# Altium footprint library lib_eps.PcbLib: 113 footprints (part 3 of 8)
Each footprint in its own frame and in the unit in brackets; x right, y up, seen from the top. Pads: shape width x height; smd on the part's side, far side on the other; paste and mask are expansions set on the pad; w line width, h text height; cw(c..) or ccw(c..) is an arc to the next point about the centre after c.
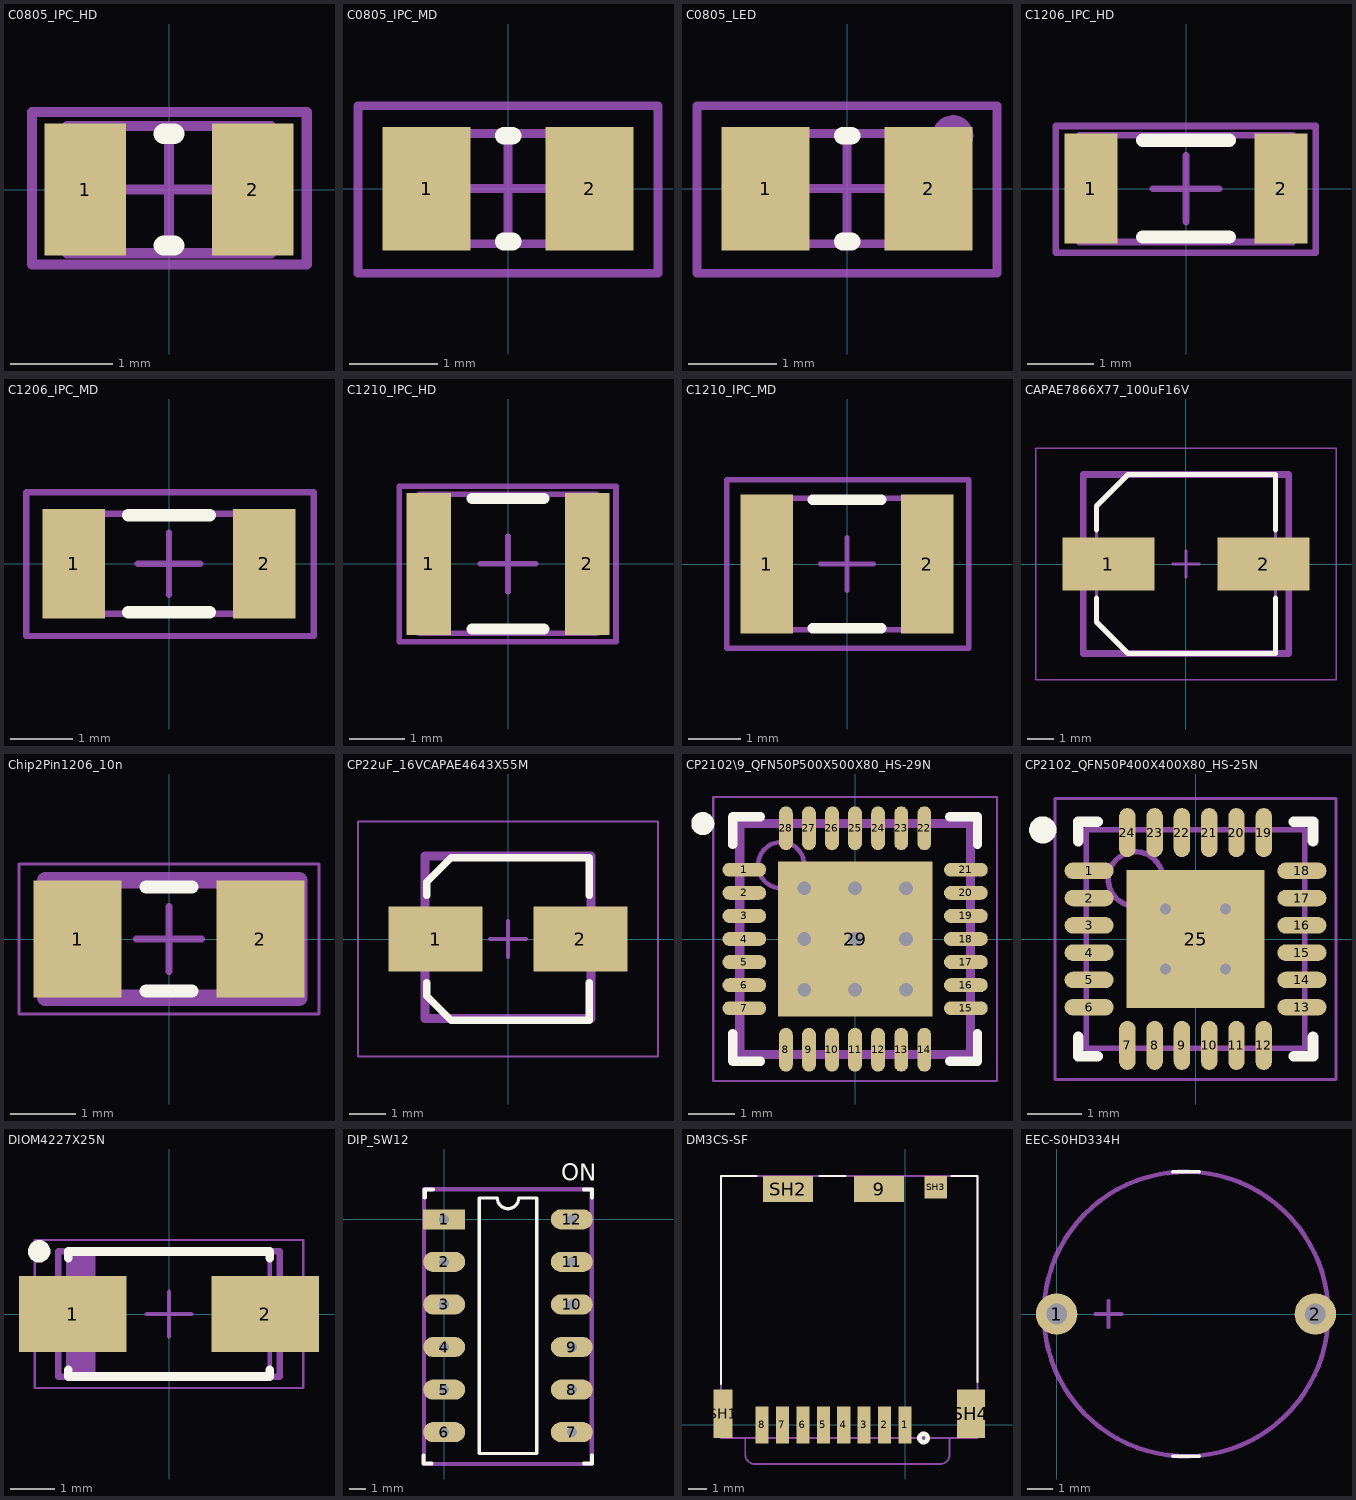
[diagram p2: the footprints below, top view; thin cyan lines are the x and y axes]

## C0805_IPC_HD [mm] "Chip Capacitor, 2-Leads, Body 2,00x1,25mm, IPC High Density"
height 1.25
pads (2):
  rect 0.8x1.3 smd: 1(-0.825,0) 2(0.825,0)
Top Overlay:
  lines w0.2: -0.05,-0.55 0.05,-0.55 ; -0.05,0.55 0.05,0.55
Mechanical 13:
  lines w0.1: -1,-0.625 -1,0.625 1,0.625 1,-0.625 -1,-0.625
Mechanical 15:
  lines w0.05: -1.35,-0.75 -1.35,0.75 1.35,0.75 1.35,-0.75 -1.35,-0.75
  lines w0.1: -0.5,0 0.5,0 ; 0,-0.5 0,0.5
Mechanical 29:
  lines w0.1: -1.346,-0.738 1.354,-0.738 1.354,0.762 -1.346,0.762 -1.346,-0.738
  text ".Designator" at -1.143,-0.356 h0.7
3D body "C0805_IPC_HD.step": height 1.25, standoff 0, extent -1,-0.625 1,0.625

## C0805_IPC_MD [mm] "Chip Capacitor, 2-Leads, Body 2,00x1,25mm, IPC Medium Density"
height 1.25
pads (2):
  rect 1x1.4 smd: 1(-0.925,0) 2(0.925,0)
Top Overlay:
  lines w0.2: -0.05,-0.6 0.05,-0.6 ; -0.05,0.6 0.05,0.6
Mechanical 13:
  lines w0.1: -1,-0.625 -1,0.625 1,0.625 1,-0.625 -1,-0.625
Mechanical 15:
  lines w0.05: -1.7,-0.95 -1.7,0.95 1.7,0.95 1.7,-0.95 -1.7,-0.95
  lines w0.1: -0.5,0 0.5,0 ; 0,-0.5 0,0.5
Mechanical 29:
  lines w0.1: -1.702,-0.96 1.698,-0.96 1.698,0.94 -1.702,0.94 -1.702,-0.96
  text ".Designator" at -1.422,-0.356 h0.7
3D body "C0805_IPC_MD.step": height 1.25, standoff 0, extent -1,-0.625 1,0.625

## C0805_LED [mm] "Chip Capacitor, 2-Leads, Body 2,00x1,25mm, IPC Medium Density"
height 1.25
pads (2):
  rect 1x1.4 smd: 1(-0.925,0) 2(0.925,0)
Top Overlay:
  lines w0.2: -0.05,-0.6 0.05,-0.6 ; -0.05,0.6 0.05,0.6
Mechanical 13:
  lines w0.1: -1,-0.625 -1,0.625 1,0.625 1,-0.625 -1,-0.625
Mechanical 15:
  lines w0.05: -1.7,-0.95 -1.7,0.95 1.7,0.95 1.7,-0.95 -1.7,-0.95
  lines w0.1: -0.5,0 0.5,0 ; 0,-0.5 0,0.5
Mechanical 29:
  circle w0.18: c1.2,0.6 r0.141
  lines w0.1: -1.702,-0.96 1.698,-0.96 1.698,0.94 -1.702,0.94 -1.702,-0.96
  text ".Designator" at -1.422,-0.356 h0.7
3D body "BL-LS0805UWC.STEP": height 0.8, standoff 0, extent -0.925,-0.625 0.875,0.625

## C1206_IPC_HD [mm] "Chip Capacitor, 2-Leads, Body 3,20x1,60mm, IPC High Density"
height 1.6
pads (2):
  rect 0.8x1.65 smd: 1(-1.425,0) 2(1.425,0)
Top Overlay:
  lines w0.2: -0.65,-0.725 0.65,-0.725 ; -0.65,0.725 0.65,0.725
Mechanical 13:
  lines w0.1: -1.6,-0.8 1.6,-0.8 1.6,0.8 -1.6,0.8 -1.6,-0.8
Mechanical 15:
  lines w0.05: -1.95,-0.95 1.95,-0.95 1.95,0.95 -1.95,0.95 -1.95,-0.95
  lines w0.1: -0.5,0 0.5,0 ; 0,-0.5 0,0.5
Mechanical 29:
  lines w0.1: -1.956,-0.96 -1.956,0.94 1.944,0.94 1.944,-0.96 -1.956,-0.96
  text ".Designator" at -1.676,-0.457 h0.8
3D body "C1206_IPC_HD.step": height 1.6, standoff 0, extent -1.6,-0.8 1.6,0.8

## C1206_IPC_MD [mm] "Chip Capacitor, 2-Leads, Body 3,20x1,60mm, IPC Medium Density"
height 1.6
pads (2):
  rect 1x1.75 smd: 1(-1.525,0) 2(1.525,0)
Top Overlay:
  lines w0.2: -0.65,-0.775 0.65,-0.775 ; -0.65,0.775 0.65,0.775
Mechanical 13:
  lines w0.1: -1.6,-0.8 1.6,-0.8 1.6,0.8 -1.6,0.8 -1.6,-0.8
Mechanical 15:
  lines w0.05: -2.3,-1.15 2.3,-1.15 2.3,1.15 -2.3,1.15 -2.3,-1.15
  lines w0.1: -0.5,0 0.5,0 ; 0,-0.5 0,0.5
Mechanical 29:
  lines w0.1: -2.286,-1.157 -2.286,1.143 2.314,1.143 2.314,-1.157 -2.286,-1.157
  text ".Designator" at -1.93,-0.432 h0.8
3D body "C1206_IPC_MD.step": height 1.6, standoff 0, extent -1.6,-0.8 1.6,0.8

## C1210_IPC_HD [mm] "Chip Capacitor, 2-Leads, Body 3,20x2,50mm, IPC High Density"
height 2.5
pads (2):
  rect 0.8x2.55 smd: 1(-1.425,0) 2(1.425,0)
Top Overlay:
  lines w0.2: -0.65,-1.175 0.65,-1.175 ; -0.65,1.175 0.65,1.175
Mechanical 13:
  lines w0.1: -1.6,-1.25 1.6,-1.25 1.6,1.25 -1.6,1.25 -1.6,-1.25
Mechanical 15:
  lines w0.05: -1.95,-1.4 1.95,-1.4 1.95,1.4 -1.95,1.4 -1.95,-1.4
  lines w0.1: -0.5,0 0.5,0 ; 0,-0.5 0,0.5
Mechanical 29:
  lines w0.1: -1.956,-1.403 -1.956,1.397 1.944,1.397 1.944,-1.403 -1.956,-1.403
  text ".Designator" at -1.626,-0.432 h0.8
3D body "C1210_IPC_HD.step": height 2.5, standoff 0, extent -1.6,-1.25 1.6,1.25

## C1210_IPC_MD [mm] "Chip Capacitor, 2-Leads, Body 3,20x2,50mm, IPC Medium Density"
height 2.5
pads (2):
  rect 1x2.65 smd: 1(-1.525,0) 2(1.525,0)
Top Overlay:
  lines w0.2: -0.65,-1.225 0.65,-1.225 ; -0.65,1.225 0.65,1.225
Mechanical 13:
  lines w0.1: -1.6,-1.25 1.6,-1.25 1.6,1.25 -1.6,1.25 -1.6,-1.25
Mechanical 15:
  lines w0.05: -2.3,-1.6 2.3,-1.6 2.3,1.6 -2.3,1.6 -2.3,-1.6
  lines w0.1: -0.5,0 0.5,0 ; 0,-0.5 0,0.5
Mechanical 29:
  lines w0.1: -2.286,-1.6 -2.286,1.6 2.314,1.6 2.314,-1.6 -2.286,-1.6
  text ".Designator" at -1.727,-0.432 h0.8
3D body "C1210_IPC_MD.step": height 2.5, standoff 0, extent -1.6,-1.25 1.6,1.25

## CAPAE7866X77_100uF16V [mm] "Aluminum Electrolytic Capacitor, Body 6,60x6,60x7,70mm, IPC Low Density"
height 7.7
pads (2):
  rect 3.5x2 smd: 1(-2.95,0) 2(2.95,0)
Top Overlay:
  lines w0.2: -3.4,-1.3 -3.4,-2.2 -2.2,-3.4 3.4,-3.4 3.4,-1.3 ; -3.4,1.3 -3.4,2.2 -2.2,3.4 3.4,3.4 3.4,1.3
Mechanical 13:
  lines w0.1: -3.4,-2.2 -3.4,2.2 -2.2,3.4 3.4,3.4 3.4,-3.4 -2.2,-3.4 -3.4,-2.2
Mechanical 15:
  lines w0.05: -5.7,-4.4 5.7,-4.4 5.7,4.4 -5.7,4.4 -5.7,-4.4
  lines w0.1: -0.5,0 0.5,0 ; 0,-0.5 0,0.5
Mechanical 29:
  lines w0.254: -3.9,-3.4 3.9,-3.4 3.9,3.4 -3.9,3.4 -3.9,-3.4
  text "'.Designator'" at -3.9,-0.6 h1.52
3D body "CAPAE7866X77_100uF16V.step": height 7.7, standoff 0, extent -3.9,-3.4 3.9,3.4

## Chip2Pin1206_10n [mm]
height 1.25
pads (2):
  rect 1.35x1.8 smd: 1(-1.4,0) 2(1.4,0)
Top Overlay:
  lines w0.2: -0.35,-0.8 0.35,-0.8 ; -0.35,0.8 0.35,0.8
Mechanical 13:
  lines w0.1: -1.675,-0.875 -1.675,0.875 1.675,0.875 1.675,-0.875 -1.675,-0.875
Mechanical 15:
  lines w0.05: -2.3,-1.15 -2.3,1.15 2.3,1.15 2.3,-1.15 -2.3,-1.15
  lines w0.1: -0.5,0 0.5,0 ; 0,-0.5 0,0.5
Mechanical 29:
  lines w0.254: -1.9,-0.9 2,-0.9 2,0.9 -1.9,0.9 -1.9,-0.9
  text "'.Designator'" at -1.5,-0.3 h0.6
3D body "Chip2Pin1206_10n.step": height 1.25, standoff 0, extent -1.675,-0.875 1.675,0.875

## CP22uF_16VCAPAE4643X55M [mm] "Aluminum Electrolytic Capacitor, Body 4,30x4,30x5,50mm, IPC Low Density"
height 5.5
pads (2):
  rect 2.6x1.8 smd: 1(-2,0) 2(2,0)
Top Overlay:
  lines w0.2: -2.25,-1.2 -2.25,-1.575 -1.575,-2.25 2.25,-2.25 2.25,-1.2 ; -2.25,1.2 -2.25,1.575 -1.575,2.25 2.25,2.25 2.25,1.2
Mechanical 13:
  lines w0.1: -2.25,-1.575 -1.575,-2.25 2.25,-2.25 2.25,2.25 -1.575,2.25 -2.25,1.575 -2.25,-1.575
Mechanical 15:
  lines w0.05: -4.15,-3.25 -4.15,3.25 4.15,3.25 4.15,-3.25 -4.15,-3.25
  lines w0.1: -0.5,0 0.5,0 ; 0,-0.5 0,0.5
Mechanical 29:
  lines w0.254: -2.3,-1 -2.3,-2.2 ; -2.3,-2.2 -2.3,2.3 2.3,2.3 2.3,-2.2 -2.3,-2.2
  text "'.Designator'" at -1.7,-0.3 h1
3D body "CP22uF_16VCAPAE4643X55M.step": height 5.5, standoff 0, extent -2.325,-2.25 2.325,2.25

## CP2102\9_QFN50P500X500X80_HS-29N [mm] "QFN, 28-Leads, Body 5,00x5,00mm, Pitch 0,50mm, Thermal Pad 3,35x3,35mm, IPC Medium Density"
height 0.8
pads (29):
  oval 0.95x0.3 smd mask+0.051: 1(-2.4,1.5) 2(-2.4,1) 3(-2.4,0.5) 4(-2.4,0) 5(-2.4,-0.5) 6(-2.4,-1) 7(-2.4,-1.5) 15(2.4,-1.5) 16(2.4,-1) 17(2.4,-0.5) 18(2.4,0) 19(2.4,0.5) 20(2.4,1) 21(2.4,1.5)
  oval 0.3x0.95 smd mask+0.051: 8(-1.5,-2.4) 9(-1,-2.4) 10(-0.5,-2.4) 11(0,-2.4) 12(0.5,-2.4) 13(1,-2.4) 14(1.5,-2.4) 22(1.5,2.4) 23(1,2.4) 24(0.5,2.4) 25(0,2.4) 27(-1,2.4) 28(-1.5,2.4)
  oval 0.3x0.95 smd mask+0.05: 26(-0.5,2.4)
  rect 3.35x3.35 smd mask+0.051: 29(0,0)
via 1.1,-1.1 diameter 0.605 hole 0.3
via 0,-1.1 diameter 0.605 hole 0.3
via -1.1,-1.1 diameter 0.605 hole 0.3
via 1.1,0 diameter 0.605 hole 0.3
via 0,0 diameter 0.605 hole 0.3
via -1.1,0 diameter 0.605 hole 0.3
via 1.1,1.1 diameter 0.605 hole 0.3
via 0,1.1 diameter 0.605 hole 0.3
via -1.1,1.1 diameter 0.605 hole 0.3
Top Overlay:
  circle w0.25: c-3.3,2.5 r0.125
  lines w0.2: -2.65,-2.05 -2.65,-2.65 -2.05,-2.65 ; -2.65,2.05 -2.65,2.65 -2.05,2.65 ; 2.05,-2.65 2.65,-2.65 2.65,-2.05 ; 2.05,2.65 2.65,2.65 2.65,2.05
Mechanical 13:
  circle w0.1: c-1.6,1.6 r0.5
  lines w0.1: -2.5,-2.5 2.5,-2.5 2.5,2.5 -2.5,2.5 -2.5,-2.5
Mechanical 15:
  lines w0.05: -3.075,-3.075 3.075,-3.075 3.075,3.075 -3.075,3.075 -3.075,-3.075
  lines w0.1: -0.5,0 0.5,0 ; 0,-0.5 0,0.5
Mechanical 29:
  lines w0.2: -2.5,-2.475 -2.475,-2.5 2.5,-2.5 2.5,2.5 -2.5,2.5 -2.5,-2.475
  text "'.Designator'" at -2,-0.35 h1
3D body "CP2102_QFN50P500X500X80_HS-29N.step": height 0.8, standoff 0, extent -2.525,-2.525 2.525,2.525

## CP2102_QFN50P400X400X80_HS-25N [mm] "QFN, 24-Leads, Body 4,00x4,00mm, Pitch 0,50mm, Thermal Pad 2,55x2,55mm, IPC Medium Density"
height 0.8
pads (25):
  oval 0.9x0.3 smd: 1(-1.95,1.25) 2(-1.95,0.75) 3(-1.95,0.25) 4(-1.95,-0.25) 5(-1.95,-0.75) 6(-1.95,-1.25) 13(1.95,-1.25) 14(1.95,-0.75) 15(1.95,-0.25) 16(1.95,0.25) 17(1.95,0.75) 18(1.95,1.25)
  oval 0.3x0.9 smd: 7(-1.25,-1.95) 8(-0.75,-1.95) 9(-0.25,-1.95) 10(0.25,-1.95) 11(0.75,-1.95) 12(1.25,-1.95) 19(1.25,1.95) 20(0.75,1.95) 21(0.25,1.95) 22(-0.25,1.95) 23(-0.75,1.95) 24(-1.25,1.95)
  rect 2.53x2.53 smd: 25(0,0)
via 0.55,-0.55 diameter 0.5 hole 0.2
via -0.55,-0.55 diameter 0.5 hole 0.2
via 0.55,0.55 diameter 0.5 hole 0.2
via -0.55,0.55 diameter 0.5 hole 0.2
Top Overlay:
  circle w0.25: c-2.8,2 r0.125
  lines w0.2: -2.15,-1.8 -2.15,-2.15 -1.8,-2.15 ; -2.15,1.8 -2.15,2.15 -1.8,2.15 ; 1.8,-2.15 2.15,-2.15 2.15,-1.8 ; 1.8,2.15 2.15,2.15 2.15,1.8
Mechanical 13:
  circle w0.1: c-1.1,1.1 r0.5
  lines w0.1: -2,-2 2,-2 2,2 -2,2 -2,-2
Mechanical 15:
  lines w0.05: -2.575,-2.575 2.575,-2.575 2.575,2.575 -2.575,2.575 -2.575,-2.575
  lines w0.1: -0.5,0 0.5,0 ; 0,-0.5 0,0.5
3D body "CP2102_QFN50P400X400X80_HS-25N.step": height 0.8, standoff 0, extent -2.025,-2.025 2.025,2.025

## DIOM4227X25N [mm] "Molded Diode, 2-Leads, Body 4,24x2,67mm, IPC Medium Density"
height 2.5
pads (2):
  rect 2.4x1.7 smd: 1(-2.15,0) 2(2.15,0)
Top Overlay:
  circle w0.25: c-2.9,1.4 r0.125
  lines w0.2: -2.25,-1.25 -2.25,-1.4 2.25,-1.4 2.25,-1.25 ; -2.25,1.25 -2.25,1.4 2.25,1.4 2.25,1.25
Mechanical 13:
  rectangle: -2.25,-1.4 -1.645,1.4
  lines w0.1: -2.25,-1.4 2.25,-1.4 2.25,1.4 -2.25,1.4 -2.25,-1.4
Mechanical 15:
  lines w0.05: -3,-1.65 3,-1.65 3,1.65 -3,1.65 -3,-1.65
  lines w0.1: -0.5,0 0.5,0 ; 0,-0.5 0,0.5
Mechanical 29:
  lines w0.15: -2.475,-1.4 2.475,-1.4 2.475,1.4 -2.475,1.4 -2.475,-1.4
  text "'.Designator'" at -2.075,-0.5 h1
3D body "DIOM4227X25N.step": height 2.5, standoff 0, extent -2.47,-1.4 2.47,1.4

## DIP_SW12 [mm]
pads (12):
  rect 2.5x1.2 hole 0.6: 1(0,0)
  oval 2.5x1.2 hole 0.6: 2(0,-2.54) 3(0,-5.08) 4(0,-7.62) 5(0,-10.16) 6(0,-12.7) 7(7.62,-12.7) 8(7.62,-10.16) 9(7.62,-7.62) 10(7.62,-5.08) 11(7.62,-2.54) 12(7.62,0)
Top Overlay:
  lines w0.2: 2.085,-13.97 5.535,-13.97 5.535,1.27 4.445,1.27 cw(c3.81,1.27) 3.175,1.27 2.085,1.27 2.085,-13.97
  lines w0.254: -1.225,-14.1 -1.225,-14.575 -0.75,-14.575 ; -1.15,1.3 -1.15,1.775 -0.675,1.775 ; 8.35,-14.575 8.825,-14.575 8.825,-14.1 ; 8.35,1.775 8.825,1.775 8.825,1.3
  text "ON" at 7,2.3 h1
Mechanical 29:
  lines w0.254: -1.2,-14.6 -1.2,1.8 8.8,1.8 8.8,-14.6 -1.2,-14.6
  text "'.Designator'" at 0.4,-7.1 h2
3D body "DIP Switch x06 Red.stp": height 6.85, standoff -3.4, extent -1.14,-14.47 8.76,1.77

## DM3CS-SF [mm] "CONN MICRO SD CARD HINGED TYPE"
pads (13):
  rect 0.7x2 smd: 1(0,0) 2(-1.1,0) 3(-2.2,0) 4(-3.3,0) 5(-4.4,0) 6(-5.5,0) 7(-6.6,0) 8(-7.7,0)
  rect 2.7x1.4 smd: 9(-1.4,12.7) SH2(-6.3,12.7)
  rect 1x2.6 smd: SH1(-9.8,0.6)
  rect 1.2x1.2 smd: SH3(1.65,12.8)
  rect 1.5x2.6 smd: SH4(3.55,0.6)
Top Overlay:
  circle w0.254: c1,-0.7 r0.224
  lines w0.1: -9.9,2.2 -9.9,13.4 -8,13.4 ; -4.6,13.4 -3.2,13.4 ; 2.5,13.4 3.9,13.4 3.9,2.3
Mechanical 29:
  lines w0.1: -8.6,-0.7 -8.6,-1.6 ccw(c-8.1,-1.6) -8.1,-2.1 1.9,-2.1 ccw(c1.9,-1.6) 2.4,-1.6 2.4,-0.7 ; -9.9,-0.7 -9.9,13.4 3.9,13.4 3.9,-0.7 -9.9,-0.7
  text "'.Designator'" at -5.8,5.6 h2
3D body "DM3CS-SF.stp": height 1.98, standoff 0.05, extent -9.9,-0.7 3.9,13.4

## EEC-S0HD334H [mm] "CAP 330MF -20% +80% 5.5V T/H"
height 6.5
pads (2):
  round 1.6 hole 0.8: 1(0,0) 2(10,0)
Top Overlay:
  lines w0.15: 4.5,-5.5 5.5,-5.5 ; 4.5,5.5 5.5,5.5
Mechanical 29:
  circle w0.18: c5,0 r5.5
  lines w0.15: 1.5,0 2.5,0 ; 2,-0.5 2,0 ; 2,0.5 2,0 ; 2.125,0 2,0
  text "'.Designator'" at 3.75,-0.5 h1
3D body "EEC-S0HD224H.STEP": height 6.14, standoff -1.96, extent -0.573,-5.25 10.927,5.25